# Altium footprint library PCB_Footprints.PcbLib: 303 footprints (part 15 of 19)
Each footprint in its own frame and in the unit in brackets; x right, y up, seen from the top. Pads: shape width x height; smd on the part's side, far side on the other; paste and mask are expansions set on the pad; w line width, h text height; cw(c..) or ccw(c..) is an arc to the next point about the centre after c.
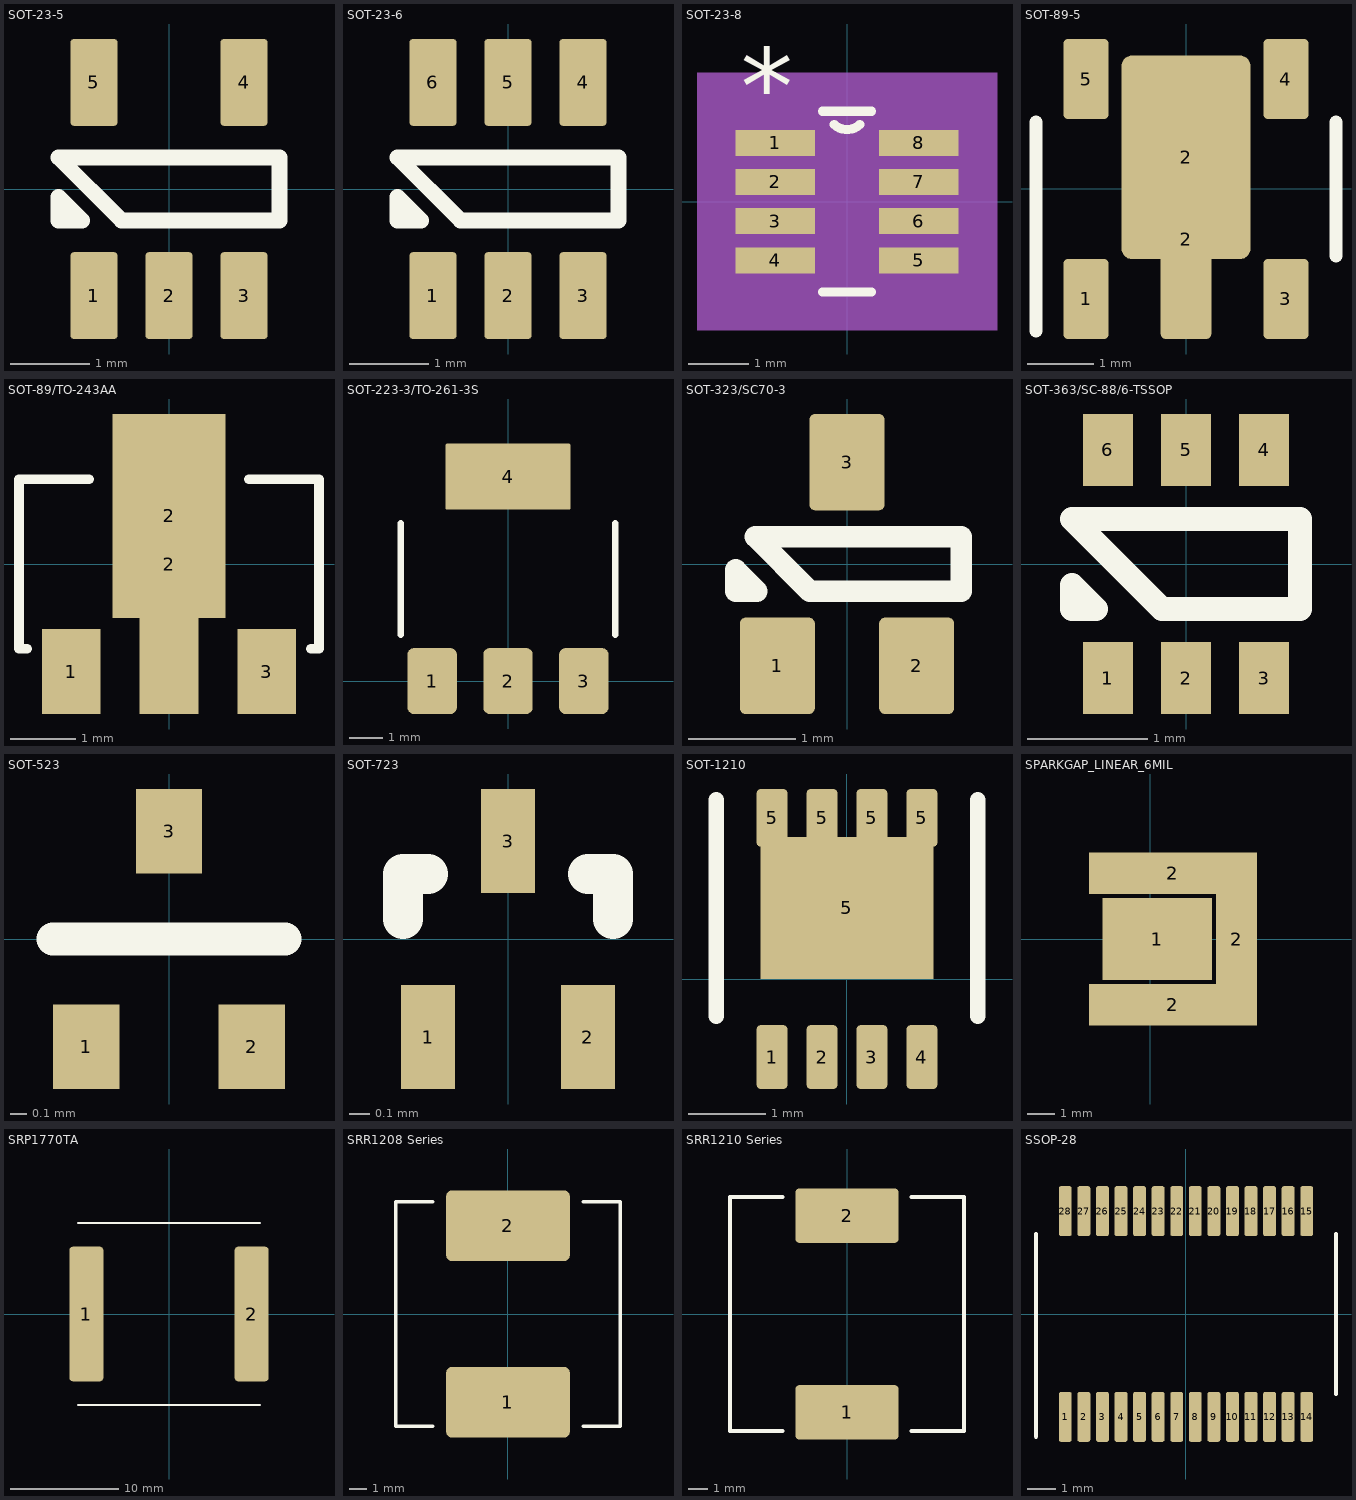
[diagram p14: the footprints below, top view; thin cyan lines are the x and y axes]

## SOT-23-5 [mm] "SOT23-5, from TI DDC (R-PDSO-G6), modified from 6 to 5 pins"
height 1.1
pads (5):
  rrect15% 0.6x1.1 smd: 1(-0.95,-1.35) 2(0,-1.35) 3(0.95,-1.35) 4(0.95,1.35) 5(-0.95,1.35)
Top Overlay:
  lines w0.2: -1.4,-0.4 -1.4,-0.1 -1.1,-0.4 -1.4,-0.4 ; -1.4,0.4 -0.6,-0.4 1.4,-0.4 1.4,0.4 -1.4,0.4
3D body "ALSRobot-SOT23-5R.step": height 1.3, standoff 0, extent -1.5,-1.5 1.5,1.5

## SOT-23-6 [mm] "SOT23-6, from TI DDC (R-PDSO-G6)"
height 1.1
pads (6):
  rrect15% 0.6x1.1 smd: 1(-0.95,-1.35) 2(0,-1.35) 3(0.95,-1.35) 4(0.95,1.35) 5(0,1.35) 6(-0.95,1.35)
Top Overlay:
  lines w0.2: -1.4,-0.4 -1.4,-0.1 -1.1,-0.4 -1.4,-0.4 ; -1.4,0.4 -0.6,-0.4 1.4,-0.4 1.4,0.4 -1.4,0.4
3D body "SOT23-6.STEP": height 1.1, standoff 0, extent -1.5,-1.375 1.5,1.375

## SOT-23-8 [mil]
pads (8):
  rect 52x17 smd: 1(-47,38.39) 2(-47,12.8) 3(-47,-12.8) 4(-47,-38.39) 5(47,-38.39) 6(47,-12.8) 7(47,12.8) 8(47,38.39)
Top Overlay:
  lines w6: -16.01,-59 16.01,-59 ; -16.01,59 16.01,59 ; -8.38,50.41 ccw(c0,59) 8.38,50.41
  text "*" at -69.5,50.39 h50
Bottom 3D Body (Mech5):
  region: 98,-84 -98,-84 -98,84 98,84
Mechanical 13:
  lines w0: -12,59 ccw(c0,59) 12,59
  lines w1: -59,-45.89 -59,-30.89 -34.5,-30.89 -34.5,-45.89 -59,-45.89 ; -59,-20.3 -59,-5.3 -34.5,-5.3 -34.5,-20.3 -59,-20.3 ; -59,5.3 -59,20.3 -34.5,20.3 -34.5,5.3 -59,5.3 ; -59,30.89 -59,45.89 -34.5,45.89 -34.5,30.89 -59,30.89 ; -34.5,-59 34.5,-59 34.5,59 -34.5,59 -34.5,-59 ; 34.5,-45.89 34.5,-30.89 59,-30.89 59,-45.89 34.5,-45.89 ; 34.5,-20.3 34.5,-5.3 59,-5.3 59,-20.3 34.5,-20.3 ; 34.5,5.3 34.5,20.3 59,20.3 59,5.3 34.5,5.3 ; 34.5,30.89 34.5,45.89 59,45.89 59,30.89 34.5,30.89
  text "*" at -69.5,50.39 h50
Mechanical 15:
  region: 83,-69 -83,-69 -83,69 83,69
  lines w6: -83,-69 -83,69 83,69 83,-69 -83,-69
3D body "DCN8.step": height 57.09, standoff 0, extent -59.02,-59.02 59.02,59.02

## SOT-89-5 [mm] "SOT89-5. From diodes.com Rev. 2017-03-20"
height 1.6
pads (6):
  rrect20% 0.68x1.2 smd: 1(-1.5,-1.65) 3(1.5,-1.65) 4(1.5,1.65) 5(-1.5,1.65)
  rrect20% 0.76x3 smd: 2(0,-0.75)
  rrect15% 1.93x3.05 smd: 2(0,0.475)
Top Overlay:
  lines w0.2: -2.25,-2.125 -2.25,1 ; 2.25,-1 2.25,1
3D body "User Library-SOT89-5-1.step": height 1.5, standoff 0, extent -2.25,-2.125 2.25,2.175

## SOT-89/TO-243AA [mm] "SOT-89 / TO-243AA, from Zetex Document number: DS36330 Rev. 1 – 2"
height 1.6
pads (4):
  rect 0.9x1.3 smd: 1(-1.5,-1.65) 3(1.5,-1.65)
  rect 0.9x4.6 smd: 2(0,0)
  rect 1.733x3.125 smd: 2(0,0.738)
Top Overlay:
  lines w0.15: -2.175,-1.3 -2.3,-1.3 -2.3,1.3 -1.225,1.3 ; 1.225,1.3 2.3,1.3 2.3,-1.3 2.175,-1.3
3D body "User Library-SOT89-3.STEP": height 1.54, standoff 0, extent -2.25,-2.25 2.25,2

## SOT-223-3/TO-261-3S [mm] "TO-261-3 / SOT-223-3 from Infineon IPN80R600P7 Datasheet, rev 2,1"
height 1.8
pads (4):
  rrect25% 1.5x2 smd: 1(-2.3,0) 2(0,0) 3(2.3,0)
  rrect5% 3.8x2 smd: 4(0,6.2)
Top Overlay:
  lines w0.2: -3.25,1.399 -3.25,4.78 ; 3.25,1.399 3.25,4.78
3D body "User Library-PG-SOT223.step": height 1.64, standoff -0.04, extent -3.25,-0.366 3.25,6.566

## SOT-323/SC70-3 [mm] "from ON Semi SC-70 (SOT-323)"
height 1.2
pads (3):
  rrect15% 0.7x0.9 smd: 1(-0.65,-0.95) 2(0.65,-0.95) 3(0,0.95)
Top Overlay:
  lines w0.2: -1.04,-0.252 -0.84,-0.252 -1.04,-0.052 -1.04,-0.252 ; -0.854,0.254 -0.346,-0.254 1.067,-0.254 1.067,0.254 -0.854,0.254
3D body "User Library-sc70-3.STEP": height 1, standoff 0, extent -1.05,-1.15 1.05,1.15

## SOT-363/SC-88/6-TSSOP [mm] "SOT-363 from Diode AP02001"
height 1.1
pads (6):
  rect 0.42x0.6 smd: 1(-0.65,-0.95) 2(0,-0.95) 3(0.65,-0.95) 4(0.65,0.95) 5(0,0.95) 6(-0.65,0.95)
Top Overlay:
  lines w0.2: -0.95,-0.375 -0.95,-0.175 -0.75,-0.375 -0.95,-0.375 ; -0.95,0.375 0.95,0.375 0.95,-0.375 -0.2,-0.375 -0.95,0.375
3D body "User Library-SOT363.step": height 1, standoff 0, extent -1.05,-1.15 1.05,1.15

## SOT-523 [mm] "SOT-523 from Diode AP02001"
height 0.9
pads (3):
  rect 0.4x0.51 smd: 1(-0.5,-0.65) 2(0.5,-0.65) 3(0,0.65)
Top Overlay:
  lines w0.2: -0.7,0 0.7,0
3D body "User Library-SOT-523.STEP": height 0.8, standoff 0, extent -0.8,-0.8 0.8,0.8

## SOT-723 [mm] "OnSemi Case 631AA Issue D"
height 0.55
pads (3):
  rect 0.27x0.52 smd: 1(-0.4,-0.49) 2(0.4,-0.49) 3(0,0.49)
Top Overlay:
  lines w0.2: -0.525,0.1 -0.525,0.325 -0.4,0.325 ; 0.4,0.325 0.525,0.325 0.525,0.1
3D body: height 0.55, standoff 0, extent -0.625,-0.425 0.625,0.425

## SOT-1210 [mm] "SOT1210/LFPAK33 from nexperia SOT1210 drawing, 4 May 2018"
height 1.1
pads (9):
  rrect25% 0.4x0.83 smd: 1(-0.975,-1.015) 2(-0.325,-1.015) 3(0.325,-1.015) 4(0.975,-1.015)
  rrect25% 0.4x0.75 smd: 5(-0.975,2.098) 5(-0.325,2.098) 5(0.325,2.098) 5(0.975,2.098)
  rect 2.25x1.85 smd paste-999: 5(0,0.925)
Top Overlay:
  lines w0.2: -1.7,-0.485 -1.7,2.335 ; 1.7,-0.485 1.7,2.335
Top Paste:
  rectangle: -0.944,0.91 -0.309,1.42
  region: 0.944,1.42 0.309,1.42 0.309,0.91 0.944,0.91
  region: 0.944,0.56 0.309,0.56 0.309,0.05 0.944,0.05
  rectangle: -0.944,0.05 -0.309,0.56
3D body: height 0.9, standoff 0, extent -1.7,-0.485 1.7,2.335

## SPARKGAP_LINEAR_6MIL [mm] "Linear Spark Gap with 6mil spacing"
pads (4):
  rect 4x3 smd paste-10 mask-10: 1(0.25,0)
  rect 6.152x1.5 smd paste-10 mask-10: 2(0.826,-2.402) 2(0.826,2.402)
  rect 1.5x3.4 smd paste-10 mask-10: 2(3.152,0)
Top Solder:
  rectangle: -1.75,-2.652 3.402,2.652

## SRP1770TA [mm] "Bourns SRP1770TA Inductor. from SRP1770TA-330 datasheet, date 08/15"
height 7
pads (2):
  rrect20% 3.15x12.5 smd: 1(-7.675,0) 2(7.675,0)
Top Overlay:
  lines w0.2: -8.45,-8.45 8.45,-8.45 ; -8.45,8.45 8.45,8.45
3D body: height 7, standoff 0, extent -8.45,-8.45 8.45,8.45
3D body: height 7, standoff 0, extent 7.45,-8.45 8.45,-7.45
3D body: height 7, standoff 0, extent 7.45,7.45 8.45,8.45
3D body: height 7, standoff 0, extent -8.45,-8.45 -7.45,-7.45
3D body: height 7, standoff 0, extent -8.45,7.45 -7.45,8.45

## SRR1208 Series [mm] "Per BOURNS Product Specification for Inductors  SRR1208 Series"
height 8.5
pads (2):
  rrect15% 7x4 smd: 1(0,-5) 2(0,5)
Top Overlay:
  lines w0.2: -4.26,-6.35 -6.35,-6.35 -6.35,6.35 -4.26,6.35 ; 4.26,-6.35 6.35,-6.35 6.35,6.35 4.26,6.35
3D body "srr1208.stp": height 8.5, standoff 0, extent -6.35,-6.35 6.35,6.35

## SRR1210 Series [mm] "Per BOURNS Product Specification for Inductors  SRR1210 Series"
height 8.5
pads (2):
  rrect15% 5.3x2.8 smd: 1(0,-5.05) 2(0,5.05)
Top Overlay:
  lines w0.2: -3.3,-6 -6,-6 -6,6 -3.3,6 ; 3.3,-6 6,-6 6,6 3.3,6
3D body: height 10, standoff 0, extent -6,-6 6,6

## SSOP-28 [mm] "28 pins Shrink Small Outline Package - 5.30mm Body - From Microchip DS20001952C"
height 2
pads (28):
  rrect35% 0.45x1.75 smd: 1(-4.225,-3.6) 2(-3.575,-3.6) 3(-2.925,-3.6) 4(-2.275,-3.6) 5(-1.625,-3.6) 6(-0.975,-3.6) 7(-0.325,-3.6) 8(0.325,-3.6) 9(0.975,-3.6) 10(1.625,-3.6) 11(2.275,-3.6) 12(2.925,-3.6) 13(3.575,-3.6) 14(4.225,-3.6) 15(4.225,3.6) 16(3.575,3.6) 17(2.925,3.6) 18(2.275,3.6) 19(1.625,3.6) 20(0.975,3.6) 21(0.325,3.6) 22(-0.325,3.6) 23(-0.975,3.6) 24(-1.625,3.6) 25(-2.275,3.6) 26(-2.925,3.6) 27(-3.575,3.6) 28(-4.225,3.6)
Top Overlay:
  lines w0.15: -5.25,-4.3 -5.25,2.8 ; 5.25,-2.8 5.25,2.8
3D body "User Library-SSOP-28-3.STEP": height 1.9, standoff 0, extent -5.1,-3.9 5.1,3.9